# Altium footprint library NXP_60_26022015.PCBLIB: 287 footprints (part 12 of 18)
Each footprint in its own frame and in the unit in brackets; x right, y up, seen from the top. Pads: shape width x height; smd on the part's side, far side on the other; paste and mask are expansions set on the pad; w line width, h text height; cw(c..) or ccw(c..) is an arc to the next point about the centre after c.
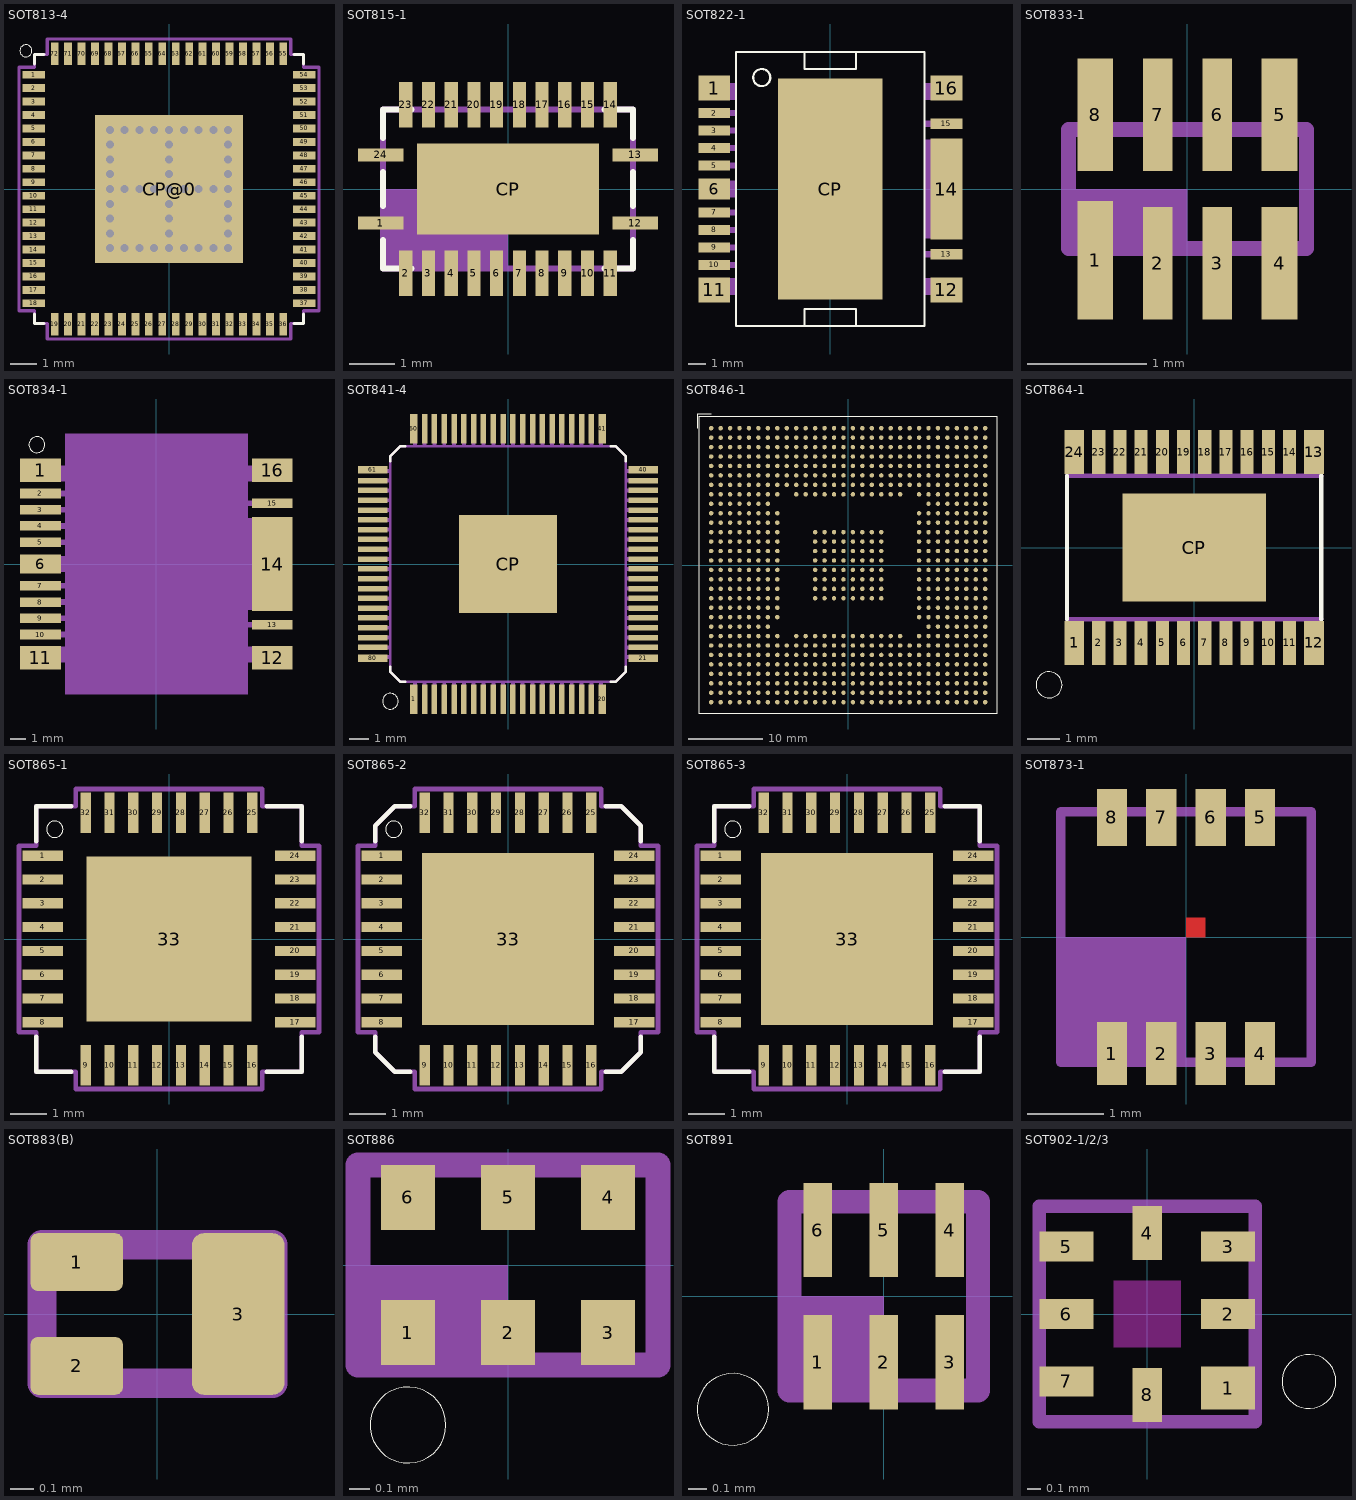
[diagram p11: the footprints below, top view; thin cyan lines are the x and y axes]

## SOT813-4 [mil]
pads (118):
  rect 33.46x11.42 smd: 1(-197.83,167.32) 2(-197.83,147.64) 3(-197.83,127.95) 4(-197.83,108.27) 5(-197.83,88.58) 6(-197.83,68.9) 7(-197.83,49.21) 8(-197.83,29.53) 9(-197.83,9.84) 10(-197.83,-9.84) 11(-197.83,-29.53) 12(-197.83,-49.21) 13(-197.83,-68.9) 14(-197.83,-88.58) 15(-197.83,-108.27) 16(-197.83,-127.95) 17(-197.83,-147.64) 18(-197.83,-167.32) 37(197.83,-167.32) 38(197.83,-147.64) 39(197.83,-127.95) 40(197.83,-108.27) 41(197.83,-88.58) 42(197.83,-68.9) 43(197.83,-49.21) 44(197.83,-29.53) 45(197.83,-9.84) 46(197.83,9.84) 47(197.83,29.53) 48(197.83,49.21) 49(197.83,68.9) 50(197.83,88.58) 51(197.83,108.27) 52(197.83,127.95) 53(197.83,147.64) 54(197.83,167.32)
  rect 11.42x33.46 smd: 19(-167.32,-197.83) 20(-147.64,-197.83) 21(-127.95,-197.83) 22(-108.27,-197.83) 23(-88.58,-197.83) 24(-68.9,-197.83) 25(-49.21,-197.83) 26(-29.53,-197.83) 27(-9.84,-197.83) 28(9.84,-197.83) 29(29.53,-197.83) 30(49.21,-197.83) 31(68.9,-197.83) 32(88.58,-197.83) 33(108.27,-197.83) 34(127.95,-197.83) 35(147.64,-197.83) 36(167.32,-197.83) 55(167.32,197.83) 56(147.64,197.83) 57(127.95,197.83) 58(108.27,197.83) 59(88.58,197.83) 60(68.9,197.83) 61(49.21,197.83) 62(29.53,197.83) 63(9.84,197.83) 64(-9.84,197.83) 65(-29.53,197.83) 66(-49.21,197.83) 67(-68.9,197.83) 68(-88.58,197.83) 69(-108.27,197.83) 70(-127.95,197.83) 71(-147.64,197.83) 72(-167.32,197.83)
  rect 216.54x216.54 smd: CP@0(0,0)
  round 16 hole 11.81: CP@1(43.31,86.61) CP@2(21.65,86.61) CP@3(0,86.61) CP@4(-21.65,86.61) CP@5(-43.31,86.61) CP@6(-64.96,86.61) CP@7(-86.61,86.61) CP@8(-86.61,64.96) CP@9(-86.61,43.31) CP@10(-86.61,21.65) CP@11(-86.61,0) CP@12(-86.61,-21.65) CP@13(-86.61,-43.31) CP@14(-86.61,-64.96) CP@15(-86.61,-86.61) CP@16(-64.96,-86.61) CP@17(-43.31,-86.61) CP@18(-21.65,-86.61) CP@19(0,-86.61) CP@20(21.65,-86.61) CP@21(43.31,-86.61) CP@22(64.96,-86.61) CP@23(86.61,-86.61) CP@24(86.61,-64.96) CP@25(86.61,-43.31) CP@26(86.61,-21.65) CP@27(86.61,0) CP@28(86.61,21.65) CP@29(86.61,43.31) CP@30(86.61,64.96) CP@31(86.61,86.61) CP@32(64.96,86.61) CP@33(0,64.96) CP@34(0,43.31) CP@35(0,21.65) CP@36(0,0) CP@37(0,-21.65) CP@38(0,-43.31) CP@39(0,-64.96) CP@40(-64.96,0) CP@41(-43.31,0) CP@42(-21.65,0) CP@43(21.65,0) CP@44(43.31,0) CP@45(64.96,0)
Top Overlay:
  circle w0: c-209.35,202.17 r8.8
  lines w5: -196.85,-183.07 -196.85,-196.85 -183.07,-196.85 ; -196.85,183.07 -196.85,196.85 -183.07,196.85 ; 183.07,-196.85 196.85,-196.85 196.85,-183.07 ; 183.07,196.85 196.85,196.85 196.85,183.07
Top Paste:
  rectangle: -68.9,17.72 -17.72,68.9
  rectangle: 17.72,17.72 68.9,68.9
  rectangle: 17.72,-68.9 68.9,-17.72
  rectangle: -68.9,-68.9 -17.72,-17.72
Top Solder:
  rectangle: -110.83,-110.83 110.83,110.83
Mechanical 16:
  lines w5: -219.49,-178.15 -219.49,178.15 -196.85,178.15 -196.85,196.85 -178.15,196.85 -178.15,219.49 178.15,219.49 178.15,196.85 196.85,196.85 196.85,178.15 219.49,178.15 219.49,-178.15 196.85,-178.15 196.85,-196.85 178.15,-196.85 178.15,-219.49 -178.15,-219.49 -178.15,-196.85 -196.85,-196.85 -196.85,-178.15 -219.49,-178.15

## SOT815-1 [mm]
pads (25):
  rect 1x0.29 smd: 1(-2.8,-0.75) 12(2.8,-0.75) 13(2.8,0.75) 24(-2.8,0.75)
  rect 0.29x1 smd: 2(-2.25,-1.85) 3(-1.75,-1.85) 4(-1.25,-1.85) 5(-0.75,-1.85) 6(-0.25,-1.85) 7(0.25,-1.85) 8(0.75,-1.85) 9(1.25,-1.85) 10(1.75,-1.85) 11(2.25,-1.85) 14(2.25,1.85) 15(1.75,1.85) 16(1.25,1.85) 17(0.75,1.85) 18(0.25,1.85) 19(-0.25,1.85) 20(-0.75,1.85) 21(-1.25,1.85) 22(-1.75,1.85) 23(-2.25,1.85)
  rect 4x2 smd: CP(0,0)
Top Overlay:
  lines w0.127: -2.75,-1.125 -2.75,-1.75 -2.125,-1.75 ; -2.75,-0.375 -2.75,0.375 ; -2.75,1.125 -2.75,1.75 -2.125,1.75 ; 2.125,-1.75 2.75,-1.75 2.75,-1.125 ; 2.125,1.75 2.75,1.75 2.75,1.125 ; 2.75,-0.375 2.75,0.375
Top Paste:
  rectangle: -0.3,0.15 0.3,0.6
  rectangle: -0.3,-0.6 0.3,-0.15
  rectangle: 0.6,0.15 1.2,0.6
  rectangle: 0.6,-0.6 1.2,-0.15
  rectangle: -1.2,0.15 -0.6,0.6
  rectangle: -1.2,-0.6 -0.6,-0.15
Mechanical 16:
  rectangle: -2.75,-1.75 0,0
  lines w0.127: -2.75,-1.75 2.75,-1.75 2.75,1.75 -2.75,1.75 -2.75,-1.75

## SOT822-1 [mm]
pads (17):
  rect 1.85x1.45 smd: 1(-6.775,5.89) 11(-6.775,-5.89) 12(6.775,-5.89) 16(6.775,5.89)
  rect 1.85x0.6 smd: 2(-6.775,4.43) 3(-6.775,3.41) 4(-6.775,2.39) 5(-6.775,1.37) 7(-6.775,-1.37) 8(-6.775,-2.39) 9(-6.775,-3.41) 10(-6.775,-4.43) 13(6.775,-3.81) 15(6.775,3.81)
  rect 1.85x1.2 smd: 6(-6.775,0)
  rect 1.85x5.9 smd: 14(6.775,0)
  rect 6.1x12.9 smd: CP(0,0)
Top Overlay:
  circle w0.127: c-4,6.5 r0.5
  lines w0.127: -1.5,-8 -5.5,-8 -5.5,8 -1.5,8 ; -1.5,-8 1.5,-8 ; -1.5,-8 -1.5,-7 1.5,-7 1.5,-8 ; -1.5,8 1.5,8 ; -1.5,8 -1.5,7 1.5,7 1.5,8 ; 1.5,-8 5.5,-8 5.5,8 1.5,8
Top Paste:
  rectangle: -7.675,5.19 -5.875,6.59
  rectangle: 5.875,5.19 7.675,6.59
  rectangle: -7.675,-6.59 -5.875,-5.19
  rectangle: 5.875,-6.59 7.675,-5.19
  rectangle: -7.675,1.095 -5.875,1.645
  rectangle: 5.875,0.225 7.675,2.925
  rectangle: -7.675,-0.575 -5.875,0.575
  rectangle: -7.675,-1.645 -5.875,-1.095
  rectangle: -7.675,2.115 -5.875,2.665
  rectangle: -7.675,-2.665 -5.875,-2.115
  rectangle: 5.875,3.535 7.675,4.085
  rectangle: -7.675,3.135 -5.875,3.685
  rectangle: -7.675,-3.685 -5.875,-3.135
  rectangle: -7.675,4.155 -5.875,4.705
  rectangle: -7.675,-4.705 -5.875,-4.155
  rectangle: 5.875,-2.925 7.675,-0.225
  rectangle: 5.875,-4.085 7.675,-3.535
  rectangle: -0.55,-0.55 0.55,0.55
  rectangle: 0.95,-0.55 2.05,0.55
  rectangle: -2.05,-0.55 -0.95,0.55
  rectangle: -2.05,0.95 -0.95,2.05
  rectangle: -0.55,0.95 0.55,2.05
  rectangle: 0.95,0.95 2.05,2.05
  rectangle: -2.05,-2.05 -0.95,-0.95
  rectangle: -0.55,-2.05 0.55,-0.95
  rectangle: 0.95,-2.05 2.05,-0.95
  rectangle: -2.05,-3.55 -0.95,-2.45
  rectangle: -0.55,-3.55 0.55,-2.45
  rectangle: 0.95,-3.55 2.05,-2.45
  rectangle: 0.95,2.45 2.05,3.55
  rectangle: -0.55,2.45 0.55,3.55
  rectangle: -2.05,2.45 -0.95,3.55
Top Solder:
  rectangle: -7.775,5.09 -5.775,6.69
  rectangle: 5.775,5.09 7.775,6.69
  rectangle: -7.775,-6.69 -5.775,-5.09
  rectangle: 5.775,-6.69 7.775,-5.09
  rectangle: -7.775,0.995 -5.775,1.745
  rectangle: 5.775,-3.025 7.775,3.025
  rectangle: -7.775,-0.675 -5.775,0.675
  rectangle: -7.775,-1.745 -5.775,-0.995
  rectangle: -7.775,2.015 -5.775,2.765
  rectangle: -7.775,-2.765 -5.775,-2.015
  rectangle: 5.775,3.435 7.775,4.185
  rectangle: -7.775,3.035 -5.775,3.785
  rectangle: -7.775,-3.785 -5.775,-3.035
  rectangle: -7.775,4.055 -5.775,4.805
  rectangle: -7.775,-4.805 -5.775,-4.055
  rectangle: 5.775,-4.185 7.775,-3.435
  rectangle: -3.123,-6.525 3.125,6.525
Mechanical 16:
  rectangle: -7.1,-0.5 -5.5,0.5
  rectangle: -7.1,-6.19 -5.5,-5.19
  rectangle: -7.1,5.19 -5.5,6.19
  rectangle: 5.5,5.19 7.1,6.19
  rectangle: 5.5,-6.19 7.1,-5.19
  rectangle: -7.1,3.23 -5.5,3.59
  rectangle: -7.1,1.19 -5.5,1.55
  rectangle: -7.1,-1.55 -5.5,-1.19
  rectangle: -7.1,2.21 -5.5,2.57
  rectangle: -7.1,-2.57 -5.5,-2.21
  rectangle: -7.1,-3.59 -5.5,-3.23
  rectangle: 5.5,-3.99 7.1,-3.63
  rectangle: -7.1,4.25 -5.5,4.61
  rectangle: -7.1,-4.61 -5.5,-4.25
  rectangle: 5.5,3.63 7.1,3.99
  rectangle: 5.5,-2.9 7.1,2.9

## SOT833-1 [mm]
pads (8):
  rect 0.3x1 smd: 1(-0.775,-0.6)
  rect 0.25x0.95 smd: 2(-0.25,-0.625) 3(0.25,-0.625) 6(0.25,0.625) 7(-0.25,0.625)
  rect 0.3x0.95 smd: 4(0.775,-0.625) 5(0.775,0.625) 8(-0.775,0.625)
Top Paste:
  rectangle: -0.9,-1.075 -0.65,-0.125
  rectangle: -0.35,-1.075 -0.15,-0.175
  rectangle: 0.15,-1.075 0.35,-0.175
  rectangle: 0.65,-1.075 0.9,-0.175
  rectangle: 0.65,0.175 0.9,1.075
  rectangle: 0.15,0.175 0.35,1.075
  rectangle: -0.35,0.175 -0.15,1.075
  rectangle: -0.9,0.175 -0.65,1.075
Mechanical 16:
  rectangle: -1,-0.5 0,0
  lines w0.127: -1,-0.5 1,-0.5 1,0.5 -1,0.5 -1,-0.5

## SOT834-1 [mm]
pads (16):
  rect 2.55x1.45 smd: 1(-7.275,5.89) 11(-7.275,-5.89) 12(7.275,-5.89) 16(7.275,5.89)
  rect 2.55x0.6 smd: 2(-7.275,4.43) 3(-7.275,3.41) 4(-7.275,2.39) 5(-7.275,1.37) 7(-7.275,-1.37) 8(-7.275,-2.39) 9(-7.275,-3.41) 10(-7.275,-4.43) 13(7.275,-3.81) 15(7.275,3.81)
  rect 2.55x1.2 smd: 6(-7.275,0)
  rect 2.55x5.9 smd: 14(7.275,0)
Top Overlay:
  circle w0: c-7.5,7.5 r0.5
Top Paste:
  rectangle: -8.525,5.19 -6.025,6.59
  rectangle: 6.025,5.19 8.525,6.59
  rectangle: -8.525,-6.59 -6.025,-5.19
  rectangle: 6.025,-6.59 8.525,-5.19
  rectangle: -8.525,1.095 -6.025,1.645
  rectangle: 6.025,0.225 8.525,2.925
  rectangle: -8.525,-0.575 -6.025,0.575
  rectangle: -8.525,-1.645 -6.025,-1.095
  rectangle: -8.525,2.115 -6.025,2.665
  rectangle: -8.525,-2.665 -6.025,-2.115
  rectangle: 6.025,3.535 8.525,4.085
  rectangle: -8.525,3.135 -6.025,3.685
  rectangle: -8.525,-3.685 -6.025,-3.135
  rectangle: -8.525,4.155 -6.025,4.705
  rectangle: -8.525,-4.705 -6.025,-4.155
  rectangle: 6.025,-2.925 8.525,-0.225
  rectangle: 6.025,-4.085 8.525,-3.535
Top Solder:
  rectangle: -8.625,5.09 -5.925,6.69
  rectangle: 5.925,5.09 8.625,6.69
  rectangle: -8.625,-6.69 -5.925,-5.09
  rectangle: 5.925,-6.69 8.625,-5.09
  rectangle: -8.625,0.995 -5.925,1.745
  rectangle: 5.925,-3.025 8.625,3.025
  rectangle: -8.625,-0.675 -5.925,0.675
  rectangle: -8.625,-1.745 -5.925,-0.995
  rectangle: -8.625,2.015 -5.925,2.765
  rectangle: -8.625,-2.765 -5.925,-2.015
  rectangle: 5.925,3.435 8.625,4.185
  rectangle: -8.625,3.035 -5.925,3.785
  rectangle: -8.625,-3.785 -5.925,-3.035
  rectangle: -8.625,4.055 -5.925,4.805
  rectangle: -8.625,-4.805 -5.925,-4.055
  rectangle: 5.925,-4.185 8.625,-3.435
Mechanical 11:
  rectangle: -5.75,-8.2 5.75,8.2
Mechanical 16:
  circle w0.127: c-4,6.5 r0.5
  rectangle: -8,-0.5 -5.5,0.5
  rectangle: -8,-6.19 -5.5,-5.19
  rectangle: -8,5.19 -5.5,6.19
  rectangle: 5.5,5.19 8,6.19
  rectangle: 5.5,-6.19 8,-5.19
  rectangle: -8,3.23 -5.5,3.59
  rectangle: -8,1.19 -5.5,1.55
  rectangle: -8,-1.55 -5.5,-1.19
  rectangle: -8,2.21 -5.5,2.57
  rectangle: -8,-2.57 -5.5,-2.21
  rectangle: -8,-3.59 -5.5,-3.23
  rectangle: 5.5,-3.99 8,-3.63
  rectangle: -8,4.25 -5.5,4.61
  rectangle: -8,-4.61 -5.5,-4.25
  rectangle: 5.5,3.63 8,3.99
  rectangle: 5.5,-2.9 8,2.9
  lines w0.127: -1.5,-8 -5.5,-8 -5.5,8 -1.5,8 ; -1.5,-8 1.5,-8 ; -1.5,-8 -1.5,-7 1.5,-7 1.5,-8 ; -1.5,8 1.5,8 ; -1.5,8 -1.5,7 1.5,7 1.5,8 ; 1.5,-8 5.5,-8 5.5,8 1.5,8

## SOT841-4 [mm]
pads (81):
  rect 0.4x1.5 smd: 1(-4.81,-6.9) 20(4.81,-6.9) 41(4.81,6.9) 60(-4.81,6.9)
  rect 0.28x1.5 smd: 2(-4.25,-6.9) 3(-3.75,-6.9) 4(-3.25,-6.9) 5(-2.75,-6.9) 6(-2.25,-6.9) 7(-1.75,-6.9) 8(-1.25,-6.9) 9(-0.75,-6.9) 10(-0.25,-6.9) 11(0.25,-6.9) 12(0.75,-6.9) 13(1.25,-6.9) 14(1.75,-6.9) 15(2.25,-6.9) 16(2.75,-6.9) 17(3.25,-6.9) 18(3.75,-6.9) 19(4.25,-6.9) 42(4.25,6.9) 43(3.75,6.9) 44(3.25,6.9) 45(2.75,6.9) 46(2.25,6.9) 47(1.75,6.9) 48(1.25,6.9) 49(0.75,6.9) 50(0.25,6.9) 51(-0.25,6.9) 52(-0.75,6.9) 53(-1.25,6.9) 54(-1.75,6.9) 55(-2.25,6.9) 56(-2.75,6.9) 57(-3.25,6.9) 58(-3.75,6.9) 59(-4.25,6.9)
  rect 1.5x0.4 smd: 21(6.9,-4.81) 40(6.9,4.81) 61(-6.9,4.81) 80(-6.9,-4.81)
  rect 1.5x0.28 smd: 22(6.9,-4.25) 23(6.9,-3.75) 24(6.9,-3.25) 25(6.9,-2.75) 26(6.9,-2.25) 27(6.9,-1.75) 28(6.9,-1.25) 29(6.9,-0.75) 30(6.9,-0.25) 31(6.9,0.25) 32(6.9,0.75) 33(6.9,1.25) 34(6.9,1.75) 35(6.9,2.25) 36(6.9,2.75) 37(6.9,3.25) 38(6.9,3.75) 39(6.9,4.25) 62(-6.9,4.25) 63(-6.9,3.75) 64(-6.9,3.25) 65(-6.9,2.75) 66(-6.9,2.25) 67(-6.9,1.75) 68(-6.9,1.25) 69(-6.9,0.75) 70(-6.9,0.25) 71(-6.9,-0.25) 72(-6.9,-0.75) 73(-6.9,-1.25) 74(-6.9,-1.75) 75(-6.9,-2.25) 76(-6.9,-2.75) 77(-6.9,-3.25) 78(-6.9,-3.75) 79(-6.9,-4.25)
  rect 5x5 smd: CP(0,0)
Top Overlay:
  circle w0: c-6,-7 r0.4
  lines w0.127: -6,-5.25 -6,-5.5 -5.5,-6 -5.25,-6 ; -6,5.25 -6,5.5 -5.5,6 -5.25,6 ; 5.25,-6 5.5,-6 6,-5.5 6,-5.25 ; 5.25,6 5.5,6 6,5.5 6,5.25
Top Paste:
  rectangle: 0.25,0.25 1.1,1.1
  rectangle: 0.25,-1.1 1.1,-0.25
  rectangle: 0.25,1.6 1.1,2.45
  rectangle: 1.6,1.6 2.45,2.45
  rectangle: 1.6,0.25 2.45,1.1
  rectangle: 1.6,-1.1 2.45,-0.25
  rectangle: 1.6,-2.45 2.45,-1.6
  rectangle: 0.25,-2.45 1.1,-1.6
  rectangle: -1.1,-1.1 -0.25,-0.25
  rectangle: -1.1,-2.45 -0.25,-1.6
  rectangle: -1.1,0.25 -0.25,1.1
  rectangle: -1.1,1.6 -0.25,2.45
  rectangle: -2.45,1.6 -1.6,2.45
  rectangle: -2.45,0.25 -1.6,1.1
  rectangle: -2.45,-1.1 -1.6,-0.25
  rectangle: -2.45,-2.45 -1.6,-1.6
Mechanical 16:
  rectangle: 0.15,6 0.35,7
  rectangle: 0.65,6 0.85,7
  rectangle: 1.15,6 1.35,7
  rectangle: 1.65,6 1.85,7
  rectangle: 2.15,6 2.35,7
  rectangle: 2.65,6 2.85,7
  rectangle: 3.15,6 3.35,7
  rectangle: 3.65,6 3.85,7
  rectangle: 4.15,6 4.35,7
  rectangle: 4.65,6 4.85,7
  rectangle: -0.35,6 -0.15,7
  rectangle: -0.85,6 -0.65,7
  rectangle: -1.35,6 -1.15,7
  rectangle: -1.85,6 -1.65,7
  rectangle: -2.35,6 -2.15,7
  rectangle: -2.85,6 -2.65,7
  rectangle: -3.35,6 -3.15,7
  rectangle: -3.85,6 -3.65,7
  rectangle: -4.35,6 -4.15,7
  rectangle: -4.85,6 -4.65,7
  region: 7,0.15 7,0.35 6,0.35 6,0.15
  region: 7,0.65 7,0.85 6,0.85 6,0.65
  region: 7,1.15 7,1.35 6,1.35 6,1.15
  region: 7,1.65 7,1.85 6,1.85 6,1.65
  region: 7,2.15 7,2.35 6,2.35 6,2.15
  region: 7,2.65 7,2.85 6,2.85 6,2.65
  region: 7,3.15 7,3.35 6,3.35 6,3.15
  region: 7,3.65 7,3.85 6,3.85 6,3.65
  region: 7,4.15 7,4.35 6,4.35 6,4.15
  region: 7,4.65 7,4.85 6,4.85 6,4.65
  region: 7,-0.35 7,-0.15 6,-0.15 6,-0.35
  region: 7,-0.85 7,-0.65 6,-0.65 6,-0.85
  region: 7,-1.35 7,-1.15 6,-1.15 6,-1.35
  region: 7,-1.85 7,-1.65 6,-1.65 6,-1.85
  region: 7,-2.35 7,-2.15 6,-2.15 6,-2.35
  region: 7,-2.85 7,-2.65 6,-2.65 6,-2.85
  region: 7,-3.35 7,-3.15 6,-3.15 6,-3.35
  region: 7,-3.85 7,-3.65 6,-3.65 6,-3.85
  region: 7,-4.35 7,-4.15 6,-4.15 6,-4.35
  region: 7,-4.85 7,-4.65 6,-4.65 6,-4.85
  rectangle: 0.15,-7 0.35,-6
  rectangle: 0.65,-7 0.85,-6
  rectangle: 1.15,-7 1.35,-6
  rectangle: 1.65,-7 1.85,-6
  rectangle: 2.15,-7 2.35,-6
  rectangle: 2.65,-7 2.85,-6
  rectangle: 3.15,-7 3.35,-6
  rectangle: 3.65,-7 3.85,-6
  rectangle: 4.15,-7 4.35,-6
  rectangle: 4.65,-7 4.85,-6
  rectangle: -0.35,-7 -0.15,-6
  rectangle: -0.85,-7 -0.65,-6
  rectangle: -1.35,-7 -1.15,-6
  rectangle: -1.85,-7 -1.65,-6
  rectangle: -2.35,-7 -2.15,-6
  rectangle: -2.85,-7 -2.65,-6
  rectangle: -3.35,-7 -3.15,-6
  rectangle: -3.85,-7 -3.65,-6
  rectangle: -4.35,-7 -4.15,-6
  rectangle: -4.85,-7 -4.65,-6
  region: -6,0.15 -6,0.35 -7,0.35 -7,0.15
  region: -6,0.65 -6,0.85 -7,0.85 -7,0.65
  region: -6,1.15 -6,1.35 -7,1.35 -7,1.15
  region: -6,1.65 -6,1.85 -7,1.85 -7,1.65
  region: -6,2.15 -6,2.35 -7,2.35 -7,2.15
  region: -6,2.65 -6,2.85 -7,2.85 -7,2.65
  region: -6,3.15 -6,3.35 -7,3.35 -7,3.15
  region: -6,3.65 -6,3.85 -7,3.85 -7,3.65
  region: -6,4.15 -6,4.35 -7,4.35 -7,4.15
  region: -6,4.65 -6,4.85 -7,4.85 -7,4.65
  region: -6,-0.35 -6,-0.15 -7,-0.15 -7,-0.35
  region: -6,-0.85 -6,-0.65 -7,-0.65 -7,-0.85
  region: -6,-1.35 -6,-1.15 -7,-1.15 -7,-1.35
  region: -6,-1.85 -6,-1.65 -7,-1.65 -7,-1.85
  region: -6,-2.35 -6,-2.15 -7,-2.15 -7,-2.35
  region: -6,-2.85 -6,-2.65 -7,-2.65 -7,-2.85
  region: -6,-3.35 -6,-3.15 -7,-3.15 -7,-3.35
  region: -6,-3.85 -6,-3.65 -7,-3.65 -7,-3.85
  region: -6,-4.35 -6,-4.15 -7,-4.15 -7,-4.35
  region: -6,-4.85 -6,-4.65 -7,-4.65 -7,-4.85
  lines w0.127: -6,-5.5 -5.5,-6 5.5,-6 6,-5.5 6,5.5 5.5,6 -5.5,6 -6,5.5 -6,-5.5

## SOT846-1 [mm]
pads (760):
  rrect100% 0.6x0.6 smd: A1(-18.415,18.415) A2(-17.145,18.415) A3(-15.875,18.415) A4(-14.605,18.415) A5(-13.335,18.415) A6(-12.065,18.415) A7(-10.795,18.415) A8(-9.525,18.415) A9(-8.255,18.415) A10(-6.985,18.415) A11(-5.715,18.415) A12(-4.445,18.415) A13(-3.175,18.415) A14(-1.905,18.415) A15(-0.635,18.415) A16(0.635,18.415) A17(1.905,18.415) A18(3.175,18.415) A19(4.445,18.415) A20(5.715,18.415) A21(6.985,18.415) A22(8.255,18.415) A23(9.525,18.415) A24(10.795,18.415) A25(12.065,18.415) A26(13.335,18.415) A27(14.605,18.415) A28(15.875,18.415) A29(17.145,18.415) A30(18.415,18.415) AA1(-18.415,-6.985) AA2(-17.145,-6.985) AA3(-15.875,-6.985) AA4(-14.605,-6.985) AA5(-13.335,-6.985) AA6(-12.065,-6.985) AA7(-10.795,-6.985) AA8(-9.525,-6.985) AA23(9.525,-6.985) AA24(10.795,-6.985) AA25(12.065,-6.985) AA26(13.335,-6.985) AA27(14.605,-6.985) AA28(15.875,-6.985) AA29(17.145,-6.985) AA30(18.415,-6.985) AB1(-18.415,-8.255) AB2(-17.145,-8.255) AB3(-15.875,-8.255) AB4(-14.605,-8.255) AB5(-13.335,-8.255) AB6(-12.065,-8.255) AB7(-10.795,-8.255) AB24(10.795,-8.255) AB25(12.065,-8.255) AB26(13.335,-8.255) AB27(14.605,-8.255) AB28(15.875,-8.255) AB29(17.145,-8.255) AB30(18.415,-8.255) AC1(-18.415,-9.525) AC2(-17.145,-9.525) AC3(-15.875,-9.525) AC4(-14.605,-9.525) AC5(-13.335,-9.525) AC6(-12.065,-9.525) AC7(-10.795,-9.525) AC8(-9.525,-9.525) AC10(-6.985,-9.525) AC11(-5.715,-9.525) AC12(-4.445,-9.525) AC13(-3.175,-9.525) AC14(-1.905,-9.525) AC15(-0.635,-9.525) AC16(0.635,-9.525) AC17(1.905,-9.525) AC18(3.175,-9.525) AC19(4.445,-9.525) AC20(5.715,-9.525) AC21(6.985,-9.525) AC23(9.525,-9.525) AC24(10.795,-9.525) AC25(12.065,-9.525) AC26(13.335,-9.525) AC27(14.605,-9.525) AC28(15.875,-9.525) AC29(17.145,-9.525) AC30(18.415,-9.525) AD1(-18.415,-10.795) AD2(-17.145,-10.795) AD3(-15.875,-10.795) AD4(-14.605,-10.795) AD5(-13.335,-10.795) AD6(-12.065,-10.795) AD7(-10.795,-10.795) AD8(-9.525,-10.795) AD9(-8.255,-10.795) AD10(-6.985,-10.795) AD11(-5.715,-10.795) AD12(-4.445,-10.795) AD13(-3.175,-10.795) AD14(-1.905,-10.795) AD15(-0.635,-10.795) AD16(0.635,-10.795) AD17(1.905,-10.795) AD18(3.175,-10.795) AD19(4.445,-10.795) AD20(5.715,-10.795) AD21(6.985,-10.795) AD22(8.255,-10.795) AD23(9.525,-10.795) AD24(10.795,-10.795) AD25(12.065,-10.795) AD26(13.335,-10.795) AD27(14.605,-10.795) AD28(15.875,-10.795) AD29(17.145,-10.795) AD30(18.415,-10.795) AE1(-18.415,-12.065) AE2(-17.145,-12.065) AE3(-15.875,-12.065) AE4(-14.605,-12.065) AE5(-13.335,-12.065) AE6(-12.065,-12.065) AE7(-10.795,-12.065) AE8(-9.525,-12.065) AE9(-8.255,-12.065) AE10(-6.985,-12.065) AE11(-5.715,-12.065) AE12(-4.445,-12.065) AE13(-3.175,-12.065) AE14(-1.905,-12.065) AE15(-0.635,-12.065) AE16(0.635,-12.065) AE17(1.905,-12.065) AE18(3.175,-12.065) AE19(4.445,-12.065) AE20(5.715,-12.065) AE21(6.985,-12.065) AE22(8.255,-12.065) AE23(9.525,-12.065) AE24(10.795,-12.065) AE25(12.065,-12.065) AE26(13.335,-12.065) AE27(14.605,-12.065) AE28(15.875,-12.065) AE29(17.145,-12.065) AE30(18.415,-12.065) AF1(-18.415,-13.335) AF2(-17.145,-13.335) AF3(-15.875,-13.335) AF4(-14.605,-13.335) AF5(-13.335,-13.335) AF6(-12.065,-13.335) AF7(-10.795,-13.335) AF8(-9.525,-13.335) AF9(-8.255,-13.335) AF10(-6.985,-13.335) AF11(-5.715,-13.335) AF12(-4.445,-13.335) AF13(-3.175,-13.335) AF14(-1.905,-13.335) AF15(-0.635,-13.335) AF16(0.635,-13.335) AF17(1.905,-13.335) AF18(3.175,-13.335) AF19(4.445,-13.335) AF20(5.715,-13.335) AF21(6.985,-13.335) AF22(8.255,-13.335) AF23(9.525,-13.335) AF24(10.795,-13.335) AF25(12.065,-13.335) AF26(13.335,-13.335) AF27(14.605,-13.335) AF28(15.875,-13.335) AF29(17.145,-13.335) AF30(18.415,-13.335) AG1(-18.415,-14.605) AG2(-17.145,-14.605) AG3(-15.875,-14.605) AG4(-14.605,-14.605) AG5(-13.335,-14.605) AG6(-12.065,-14.605) AG7(-10.795,-14.605) AG8(-9.525,-14.605) AG9(-8.255,-14.605) AG10(-6.985,-14.605) AG11(-5.715,-14.605) AG12(-4.445,-14.605) AG13(-3.175,-14.605) AG14(-1.905,-14.605) AG15(-0.635,-14.605) AG16(0.635,-14.605) AG17(1.905,-14.605) AG18(3.175,-14.605) AG19(4.445,-14.605) AG20(5.715,-14.605) AG21(6.985,-14.605) AG22(8.255,-14.605) AG23(9.525,-14.605) AG24(10.795,-14.605) AG25(12.065,-14.605) AG26(13.335,-14.605) AG27(14.605,-14.605) AG28(15.875,-14.605) AG29(17.145,-14.605) AG30(18.415,-14.605) AH1(-18.415,-15.875) AH2(-17.145,-15.875) AH3(-15.875,-15.875) AH4(-14.605,-15.875) AH5(-13.335,-15.875) AH6(-12.065,-15.875) AH7(-10.795,-15.875) AH8(-9.525,-15.875) AH9(-8.255,-15.875) AH10(-6.985,-15.875) AH11(-5.715,-15.875) AH12(-4.445,-15.875) AH13(-3.175,-15.875) AH14(-1.905,-15.875) AH15(-0.635,-15.875) AH16(0.635,-15.875) AH17(1.905,-15.875) AH18(3.175,-15.875) AH19(4.445,-15.875) AH20(5.715,-15.875) AH21(6.985,-15.875) AH22(8.255,-15.875) AH23(9.525,-15.875) AH24(10.795,-15.875) AH25(12.065,-15.875) AH26(13.335,-15.875) AH27(14.605,-15.875) AH28(15.875,-15.875) AH29(17.145,-15.875) AH30(18.415,-15.875) AJ1(-18.415,-17.145) AJ2(-17.145,-17.145) AJ3(-15.875,-17.145) AJ4(-14.605,-17.145) AJ5(-13.335,-17.145) AJ6(-12.065,-17.145) AJ7(-10.795,-17.145) AJ8(-9.525,-17.145) AJ9(-8.255,-17.145) AJ10(-6.985,-17.145) AJ11(-5.715,-17.145) AJ12(-4.445,-17.145) AJ13(-3.175,-17.145) AJ14(-1.905,-17.145) AJ15(-0.635,-17.145) AJ16(0.635,-17.145) AJ17(1.905,-17.145) AJ18(3.175,-17.145) AJ19(4.445,-17.145) AJ20(5.715,-17.145) AJ21(6.985,-17.145) AJ22(8.255,-17.145) AJ23(9.525,-17.145) AJ24(10.795,-17.145) AJ25(12.065,-17.145) AJ26(13.335,-17.145) AJ27(14.605,-17.145) AJ28(15.875,-17.145) AJ29(17.145,-17.145) AJ30(18.415,-17.145) AK1(-18.415,-18.415) AK2(-17.145,-18.415) AK3(-15.875,-18.415) AK4(-14.605,-18.415) AK5(-13.335,-18.415) AK6(-12.065,-18.415) AK7(-10.795,-18.415) AK8(-9.525,-18.415) AK9(-8.255,-18.415) AK10(-6.985,-18.415) AK11(-5.715,-18.415) AK12(-4.445,-18.415) AK13(-3.175,-18.415) AK14(-1.905,-18.415) AK15(-0.635,-18.415) AK16(0.635,-18.415) AK17(1.905,-18.415) AK18(3.175,-18.415) AK19(4.445,-18.415) AK20(5.715,-18.415) AK21(6.985,-18.415) AK22(8.255,-18.415) AK23(9.525,-18.415) AK24(10.795,-18.415) AK25(12.065,-18.415) AK26(13.335,-18.415) AK27(14.605,-18.415) AK28(15.875,-18.415) AK29(17.145,-18.415) AK30(18.415,-18.415) B1(-18.415,17.145) B2(-17.145,17.145) B3(-15.875,17.145) B4(-14.605,17.145) B5(-13.335,17.145) B6(-12.065,17.145) B7(-10.795,17.145) B8(-9.525,17.145) B9(-8.255,17.145) B10(-6.985,17.145) B11(-5.715,17.145) B12(-4.445,17.145) B13(-3.175,17.145) B14(-1.905,17.145) B15(-0.635,17.145) B16(0.635,17.145) B17(1.905,17.145) B18(3.175,17.145) B19(4.445,17.145) B20(5.715,17.145) B21(6.985,17.145) B22(8.255,17.145) B23(9.525,17.145) B24(10.795,17.145) B25(12.065,17.145) B26(13.335,17.145) B27(14.605,17.145) B28(15.875,17.145) B29(17.145,17.145) B30(18.415,17.145) C1(-18.415,15.875) C2(-17.145,15.875) C3(-15.875,15.875) C4(-14.605,15.875) C5(-13.335,15.875) C6(-12.065,15.875) C7(-10.795,15.875) C8(-9.525,15.875) C9(-8.255,15.875) C10(-6.985,15.875) C11(-5.715,15.875) C12(-4.445,15.875) C13(-3.175,15.875) C14(-1.905,15.875) C15(-0.635,15.875) C16(0.635,15.875) C17(1.905,15.875) C18(3.175,15.875) C19(4.445,15.875) C20(5.715,15.875) C21(6.985,15.875) C22(8.255,15.875) C23(9.525,15.875) C24(10.795,15.875) C25(12.065,15.875) C26(13.335,15.875) C27(14.605,15.875) C28(15.875,15.875) C29(17.145,15.875) C30(18.415,15.875) D1(-18.415,14.605) D2(-17.145,14.605) D3(-15.875,14.605) D4(-14.605,14.605) D5(-13.335,14.605) D6(-12.065,14.605) D7(-10.795,14.605) D8(-9.525,14.605) D9(-8.255,14.605) D10(-6.985,14.605) D11(-5.715,14.605) D12(-4.445,14.605) D13(-3.175,14.605) D14(-1.905,14.605) D15(-0.635,14.605) D16(0.635,14.605) D17(1.905,14.605) D18(3.175,14.605) D19(4.445,14.605) D20(5.715,14.605) D21(6.985,14.605) D22(8.255,14.605) D23(9.525,14.605) D24(10.795,14.605) D25(12.065,14.605) D26(13.335,14.605) D27(14.605,14.605) D28(15.875,14.605) D29(17.145,14.605) D30(18.415,14.605) E1(-18.415,13.335) E2(-17.145,13.335) E3(-15.875,13.335) E4(-14.605,13.335) E5(-13.335,13.335) E6(-12.065,13.335) E7(-10.795,13.335) E8(-9.525,13.335) E9(-8.255,13.335) E10(-6.985,13.335) E11(-5.715,13.335) E12(-4.445,13.335) E13(-3.175,13.335) E14(-1.905,13.335) E15(-0.635,13.335) E16(0.635,13.335) E17(1.905,13.335) E18(3.175,13.335) E19(4.445,13.335) E20(5.715,13.335) E21(6.985,13.335) E22(8.255,13.335) E23(9.525,13.335) E24(10.795,13.335) E25(12.065,13.335) E26(13.335,13.335) E27(14.605,13.335) E28(15.875,13.335) E29(17.145,13.335) E30(18.415,13.335) F1(-18.415,12.065) F2(-17.145,12.065) F3(-15.875,12.065) F4(-14.605,12.065) F5(-13.335,12.065) F6(-12.065,12.065) F7(-10.795,12.065) F8(-9.525,12.065) F9(-8.255,12.065) F10(-6.985,12.065) F11(-5.715,12.065) F12(-4.445,12.065) F13(-3.175,12.065) F14(-1.905,12.065) F15(-0.635,12.065) F16(0.635,12.065) F17(1.905,12.065) F18(3.175,12.065) F19(4.445,12.065) F20(5.715,12.065) F21(6.985,12.065) F22(8.255,12.065) F23(9.525,12.065) F24(10.795,12.065) F25(12.065,12.065) F26(13.335,12.065) F27(14.605,12.065) F28(15.875,12.065) F29(17.145,12.065) F30(18.415,12.065) G1(-18.415,10.795) G2(-17.145,10.795) G3(-15.875,10.795) G4(-14.605,10.795) G5(-13.335,10.795) G6(-12.065,10.795) G7(-10.795,10.795) G8(-9.525,10.795) G9(-8.255,10.795) G10(-6.985,10.795) G11(-5.715,10.795) G12(-4.445,10.795) G13(-3.175,10.795) G14(-1.905,10.795) G15(-0.635,10.795) G16(0.635,10.795) G17(1.905,10.795) G18(3.175,10.795) G19(4.445,10.795) G20(5.715,10.795) G21(6.985,10.795) G22(8.255,10.795) G23(9.525,10.795) G24(10.795,10.795) G25(12.065,10.795) G26(13.335,10.795) G27(14.605,10.795) G28(15.875,10.795) G29(17.145,10.795) G30(18.415,10.795) H1(-18.415,9.525) H2(-17.145,9.525) H3(-15.875,9.525) H4(-14.605,9.525) H5(-13.335,9.525) H6(-12.065,9.525) H7(-10.795,9.525) H8(-9.525,9.525) H10(-6.985,9.525) H11(-5.715,9.525) H12(-4.445,9.525) H13(-3.175,9.525) H14(-1.905,9.525) H15(-0.635,9.525) H16(0.635,9.525) H17(1.905,9.525) H18(3.175,9.525) H19(4.445,9.525) H20(5.715,9.525) H21(6.985,9.525) H23(9.525,9.525) H24(10.795,9.525) H25(12.065,9.525) H26(13.335,9.525) H27(14.605,9.525) H28(15.875,9.525) H29(17.145,9.525) H30(18.415,9.525) J1(-18.415,8.255) J2(-17.145,8.255) J3(-15.875,8.255) J4(-14.605,8.255) J5(-13.335,8.255) J6(-12.065,8.255) J7(-10.795,8.255) J24(10.795,8.255) J25(12.065,8.255) J26(13.335,8.255) J27(14.605,8.255) J28(15.875,8.255) J29(17.145,8.255) J30(18.415,8.255) K1(-18.415,6.985) K2(-17.145,6.985) K3(-15.875,6.985) K4(-14.605,6.985) K5(-13.335,6.985) K6(-12.065,6.985) K7(-10.795,6.985) K8(-9.525,6.985) K23(9.525,6.985) K24(10.795,6.985) K25(12.065,6.985) K26(13.335,6.985) K27(14.605,6.985) K28(15.875,6.985) K29(17.145,6.985) K30(18.415,6.985) L1(-18.415,5.715) L2(-17.145,5.715) L3(-15.875,5.715) L4(-14.605,5.715) L5(-13.335,5.715) L6(-12.065,5.715) L7(-10.795,5.715) L8(-9.525,5.715) L23(9.525,5.715) L24(10.795,5.715) L25(12.065,5.715) L26(13.335,5.715) L27(14.605,5.715) L28(15.875,5.715) L29(17.145,5.715) L30(18.415,5.715) M1(-18.415,4.445) M2(-17.145,4.445) M3(-15.875,4.445) M4(-14.605,4.445) M5(-13.335,4.445) M6(-12.065,4.445) M7(-10.795,4.445) M8(-9.525,4.445) M12(-4.445,4.445) M13(-3.175,4.445) M14(-1.905,4.445) M15(-0.635,4.445) M16(0.635,4.445) M17(1.905,4.445) M18(3.175,4.445) M19(4.445,4.445) M23(9.525,4.445) M24(10.795,4.445) M25(12.065,4.445) M26(13.335,4.445) M27(14.605,4.445) M28(15.875,4.445) M29(17.145,4.445) M30(18.415,4.445) N1(-18.415,3.175) N2(-17.145,3.175) N3(-15.875,3.175) N4(-14.605,3.175) N5(-13.335,3.175) N6(-12.065,3.175) N7(-10.795,3.175) N8(-9.525,3.175) N12(-4.445,3.175) N13(-3.175,3.175) N14(-1.905,3.175) N15(-0.635,3.175) N16(0.635,3.175) N17(1.905,3.175) N18(3.175,3.175) N19(4.445,3.175) N23(9.525,3.175) N24(10.795,3.175) N25(12.065,3.175) N26(13.335,3.175) N27(14.605,3.175) N28(15.875,3.175) N29(17.145,3.175) N30(18.415,3.175) P1(-18.415,1.905) P2(-17.145,1.905) P3(-15.875,1.905) P4(-14.605,1.905) P5(-13.335,1.905) P6(-12.065,1.905) P7(-10.795,1.905) P8(-9.525,1.905) P12(-4.445,1.905) P13(-3.175,1.905) P14(-1.905,1.905) P15(-0.635,1.905) P16(0.635,1.905) P17(1.905,1.905) P18(3.175,1.905) P19(4.445,1.905) P23(9.525,1.905) P24(10.795,1.905) P25(12.065,1.905) P26(13.335,1.905) P27(14.605,1.905) P28(15.875,1.905) P29(17.145,1.905) P30(18.415,1.905) R1(-18.415,0.635) R2(-17.145,0.635) R3(-15.875,0.635) R4(-14.605,0.635) R5(-13.335,0.635) R6(-12.065,0.635) R7(-10.795,0.635) R8(-9.525,0.635) R12(-4.445,0.635) R13(-3.175,0.635) R14(-1.905,0.635) R15(-0.635,0.635) R16(0.635,0.635) R17(1.905,0.635) R18(3.175,0.635) R19(4.445,0.635) R23(9.525,0.635) R24(10.795,0.635) R25(12.065,0.635) R26(13.335,0.635) R27(14.605,0.635) R28(15.875,0.635) R29(17.145,0.635) R30(18.415,0.635) T1(-18.415,-0.635) T2(-17.145,-0.635) T3(-15.875,-0.635) T4(-14.605,-0.635) T5(-13.335,-0.635) T6(-12.065,-0.635) T7(-10.795,-0.635) T8(-9.525,-0.635) T12(-4.445,-0.635) T13(-3.175,-0.635) T14(-1.905,-0.635) T15(-0.635,-0.635) T16(0.635,-0.635) T17(1.905,-0.635) T18(3.175,-0.635) T19(4.445,-0.635) T23(9.525,-0.635) T24(10.795,-0.635) T25(12.065,-0.635) T26(13.335,-0.635) T27(14.605,-0.635) T28(15.875,-0.635) T29(17.145,-0.635) T30(18.415,-0.635) U1(-18.415,-1.905) U2(-17.145,-1.905) U3(-15.875,-1.905) U4(-14.605,-1.905) U5(-13.335,-1.905) U6(-12.065,-1.905) U7(-10.795,-1.905) U8(-9.525,-1.905) U12(-4.445,-1.905) U13(-3.175,-1.905) U14(-1.905,-1.905) U15(-0.635,-1.905) U16(0.635,-1.905) U17(1.905,-1.905) U18(3.175,-1.905) U19(4.445,-1.905) U23(9.525,-1.905) U24(10.795,-1.905) U25(12.065,-1.905) U26(13.335,-1.905) U27(14.605,-1.905) U28(15.875,-1.905) U29(17.145,-1.905) U30(18.415,-1.905) V1(-18.415,-3.175) V2(-17.145,-3.175) V3(-15.875,-3.175) V4(-14.605,-3.175) V5(-13.335,-3.175) V6(-12.065,-3.175) V7(-10.795,-3.175) V8(-9.525,-3.175) V12(-4.445,-3.175) V13(-3.175,-3.175) V14(-1.905,-3.175) V15(-0.635,-3.175) V16(0.635,-3.175) V17(1.905,-3.175) V18(3.175,-3.175) V19(4.445,-3.175) V23(9.525,-3.175) V24(10.795,-3.175) V25(12.065,-3.175) V26(13.335,-3.175) V27(14.605,-3.175) V28(15.875,-3.175) V29(17.145,-3.175) V30(18.415,-3.175) W1(-18.415,-4.445) W2(-17.145,-4.445) W3(-15.875,-4.445) W4(-14.605,-4.445) W5(-13.335,-4.445) W6(-12.065,-4.445) W7(-10.795,-4.445) W8(-9.525,-4.445) W12(-4.445,-4.445) W13(-3.175,-4.445) W14(-1.905,-4.445) W15(-0.635,-4.445) W16(0.635,-4.445) W17(1.905,-4.445) W18(3.175,-4.445) W19(4.445,-4.445) W23(9.525,-4.445) W24(10.795,-4.445) W25(12.065,-4.445) W26(13.335,-4.445) W27(14.605,-4.445) W28(15.875,-4.445) W29(17.145,-4.445) W30(18.415,-4.445) Y1(-18.415,-5.715) Y2(-17.145,-5.715) Y3(-15.875,-5.715) Y4(-14.605,-5.715) Y5(-13.335,-5.715) Y6(-12.065,-5.715) Y7(-10.795,-5.715) Y8(-9.525,-5.715) Y23(9.525,-5.715) Y24(10.795,-5.715) Y25(12.065,-5.715) Y26(13.335,-5.715) Y27(14.605,-5.715) Y28(15.875,-5.715) Y29(17.145,-5.715) Y30(18.415,-5.715)
Top Overlay:
  lines w0.127: -20.32,18.415 -20.32,20.32 -18.415,20.32 ; -20,-20 20,-20 20,20 -20,20 -20,-20
Top Paste:
  drawing of 760 lines, arcs and shapes, not listed
Top Solder:
  drawing of 760 lines, arcs and shapes, not listed

## SOT864-1 [mm]
pads (25):
  rect 0.6x1.35 smd: 1(-3.675,-2.925) 12(3.675,-2.925) 13(3.675,2.925) 24(-3.675,2.925)
  rect 0.4x1.35 smd: 2(-2.925,-2.925) 3(-2.275,-2.925) 4(-1.625,-2.925) 5(-0.975,-2.925) 6(-0.325,-2.925) 7(0.325,-2.925) 8(0.975,-2.925) 9(1.625,-2.925) 10(2.275,-2.925) 11(2.925,-2.925) 14(2.925,2.925) 15(2.275,2.925) 16(1.625,2.925) 17(0.975,2.925) 18(0.325,2.925) 19(-0.325,2.925) 20(-0.975,2.925) 21(-1.625,2.925) 22(-2.275,2.925) 23(-2.925,2.925)
  rect 4.4x3.3 smd: CP(0,0)
Top Overlay:
  circle w0: c-4.45,-4.21 r0.4
  lines w0.127: -3.9,-2.2 -3.9,2.2 ; 3.9,-2.2 3.9,2.2
Top Paste:
  rectangle: -1.3,0.325 -0.325,1.3
  rectangle: 0.325,0.325 1.3,1.3
  rectangle: -1.3,-1.3 -0.325,-0.325
  rectangle: 0.325,-1.3 1.3,-0.325
Mechanical 16:
  rectangle: -0.45,2.2 -0.2,3.2
  rectangle: -1.1,2.2 -0.85,3.2
  rectangle: -1.75,2.2 -1.5,3.2
  rectangle: -2.4,2.2 -2.15,3.2
  rectangle: -3.05,2.2 -2.8,3.2
  rectangle: -3.7,2.2 -3.45,3.2
  rectangle: 0.2,2.2 0.45,3.2
  rectangle: 0.85,2.2 1.1,3.2
  rectangle: 1.5,2.2 1.75,3.2
  rectangle: 2.15,2.2 2.4,3.2
  rectangle: 2.8,2.2 3.05,3.2
  rectangle: 3.45,2.2 3.7,3.2
  rectangle: -0.45,-3.2 -0.2,-2.2
  rectangle: -1.1,-3.2 -0.85,-2.2
  rectangle: -1.75,-3.2 -1.5,-2.2
  rectangle: -2.4,-3.2 -2.15,-2.2
  rectangle: -3.05,-3.2 -2.8,-2.2
  rectangle: -3.7,-3.2 -3.45,-2.2
  rectangle: 0.2,-3.2 0.45,-2.2
  rectangle: 0.85,-3.2 1.1,-2.2
  rectangle: 1.5,-3.2 1.75,-2.2
  rectangle: 2.15,-3.2 2.4,-2.2
  rectangle: 2.8,-3.2 3.05,-2.2
  rectangle: 3.45,-3.2 3.7,-2.2
  lines w0.127: -3.9,-2.2 3.9,-2.2 ; -3.9,2.2 3.9,2.2

## SOT865-1 [mm]
pads (33):
  rect 1.1x0.28 smd: 1(-3.45,2.275) 2(-3.45,1.625) 3(-3.45,0.975) 4(-3.45,0.325) 5(-3.45,-0.325) 6(-3.45,-0.975) 7(-3.45,-1.625) 8(-3.45,-2.275) 17(3.45,-2.275) 18(3.45,-1.625) 19(3.45,-0.975) 20(3.45,-0.325) 21(3.45,0.325) 22(3.45,0.975) 23(3.45,1.625) 24(3.45,2.275)
  rect 0.28x1.1 smd: 9(-2.275,-3.45) 10(-1.625,-3.45) 11(-0.975,-3.45) 12(-0.325,-3.45) 13(0.325,-3.45) 14(0.975,-3.45) 15(1.625,-3.45) 16(2.275,-3.45) 25(2.275,3.45) 26(1.625,3.45) 27(0.975,3.45) 28(0.325,3.45) 29(-0.325,3.45) 30(-0.975,3.45) 31(-1.625,3.45) 32(-2.275,3.45)
  rect 4.5x4.5 smd: 33(0,0)
Top Overlay:
  circle w0: c-3.12,3 r0.224
  lines w0.127: -3.625,-2.675 -3.625,-3.625 -2.675,-3.625 ; -3.625,2.675 -3.625,3.625 -2.675,3.625 ; 2.675,-3.625 3.625,-3.625 3.625,-2.675 ; 2.675,3.625 3.625,3.625 3.625,2.675
Top Paste:
  rectangle: -0.35,-0.35 0.35,0.35
  rectangle: 0.65,-0.35 1.35,0.35
  rectangle: -1.35,-0.35 -0.65,0.35
  rectangle: -1.35,0.65 -0.65,1.35
  rectangle: -0.35,0.65 0.35,1.35
  rectangle: 0.65,0.65 1.35,1.35
  rectangle: -1.35,-1.35 -0.65,-0.65
  rectangle: -0.35,-1.35 0.35,-0.65
  rectangle: 0.65,-1.35 1.35,-0.65
Mechanical 16:
  lines w0.127: -4.1,-2.55 -4.1,2.55 -3.625,2.55 -3.625,3.625 -2.55,3.625 -2.55,4.1 2.55,4.1 2.55,3.625 3.625,3.625 3.625,2.55 4.1,2.55 4.1,-2.55 3.625,-2.55 3.625,-3.625 2.55,-3.625 2.55,-4.1 -2.55,-4.1 -2.55,-3.625 -3.625,-3.625 -3.625,-2.55 -4.1,-2.55
  text "SOT865-1" at -0.75,-2 h0.17

## SOT865-2 [mm]
pads (33):
  rect 1.1x0.28 smd: 1(-3.45,2.275) 2(-3.45,1.625) 3(-3.45,0.975) 4(-3.45,0.325) 5(-3.45,-0.325) 6(-3.45,-0.975) 7(-3.45,-1.625) 8(-3.45,-2.275) 17(3.45,-2.275) 18(3.45,-1.625) 19(3.45,-0.975) 20(3.45,-0.325) 21(3.45,0.325) 22(3.45,0.975) 23(3.45,1.625) 24(3.45,2.275)
  rect 0.28x1.1 smd: 9(-2.275,-3.45) 10(-1.625,-3.45) 11(-0.975,-3.45) 12(-0.325,-3.45) 13(0.325,-3.45) 14(0.975,-3.45) 15(1.625,-3.45) 16(2.275,-3.45) 25(2.275,3.45) 26(1.625,3.45) 27(0.975,3.45) 28(0.325,3.45) 29(-0.325,3.45) 30(-0.975,3.45) 31(-1.625,3.45) 32(-2.275,3.45)
  rect 4.7x4.7 smd: 33(0,0)
Top Overlay:
  circle w0: c-3.12,3 r0.224
  lines w0.127: -3.625,-2.675 -3.625,-3.1 -3.1,-3.625 -2.675,-3.625 ; -3.625,2.675 -3.625,3.1 -3.1,3.625 -2.675,3.625 ; 2.675,-3.625 3.1,-3.625 3.625,-3.1 3.625,-2.675 ; 2.675,3.625 3.1,3.625 3.625,3.1 3.625,2.675
Top Paste:
  rectangle: -0.35,-0.35 0.35,0.35
  rectangle: 0.65,-0.35 1.35,0.35
  rectangle: -1.35,-0.35 -0.65,0.35
  rectangle: -1.35,0.65 -0.65,1.35
  rectangle: -0.35,0.65 0.35,1.35
  rectangle: 0.65,0.65 1.35,1.35
  rectangle: -1.35,-1.35 -0.65,-0.65
  rectangle: -0.35,-1.35 0.35,-0.65
  rectangle: 0.65,-1.35 1.35,-0.65
Mechanical 16:
  lines w0.127: -4.1,-2.55 -4.1,2.55 -3.625,2.55 -3.625,3.1 -3.1,3.625 -2.55,3.625 -2.55,4.1 2.55,4.1 2.55,3.625 3.1,3.625 3.625,3.1 3.625,2.55 4.1,2.55 4.1,-2.55 3.625,-2.55 3.625,-3.1 3.1,-3.625 2.55,-3.625 2.55,-4.1 -2.55,-4.1 -2.55,-3.625 -3.1,-3.625 -3.625,-3.1 -3.625,-2.55 -4.1,-2.55
  text "SOT865-2" at -0.75,-2 h0.17

## SOT865-3 [mm]
pads (33):
  rect 1.1x0.28 smd: 1(-3.45,2.275) 2(-3.45,1.625) 3(-3.45,0.975) 4(-3.45,0.325) 5(-3.45,-0.325) 6(-3.45,-0.975) 7(-3.45,-1.625) 8(-3.45,-2.275) 17(3.45,-2.275) 18(3.45,-1.625) 19(3.45,-0.975) 20(3.45,-0.325) 21(3.45,0.325) 22(3.45,0.975) 23(3.45,1.625) 24(3.45,2.275)
  rect 0.28x1.1 smd: 9(-2.275,-3.45) 10(-1.625,-3.45) 11(-0.975,-3.45) 12(-0.325,-3.45) 13(0.325,-3.45) 14(0.975,-3.45) 15(1.625,-3.45) 16(2.275,-3.45) 25(2.275,3.45) 26(1.625,3.45) 27(0.975,3.45) 28(0.325,3.45) 29(-0.325,3.45) 30(-0.975,3.45) 31(-1.625,3.45) 32(-2.275,3.45)
  rect 4.7x4.7 smd: 33(0,0)
Top Overlay:
  circle w0: c-3.12,3 r0.224
  lines w0.127: -3.625,-2.675 -3.625,-3.625 -2.675,-3.625 ; -3.625,2.675 -3.625,3.625 -2.675,3.625 ; 2.675,-3.625 3.625,-3.625 3.625,-2.675 ; 2.675,3.625 3.625,3.625 3.625,2.675
Top Paste:
  rectangle: -0.35,-0.35 0.35,0.35
  rectangle: 0.65,-0.35 1.35,0.35
  rectangle: -1.35,-0.35 -0.65,0.35
  rectangle: -1.35,0.65 -0.65,1.35
  rectangle: -0.35,0.65 0.35,1.35
  rectangle: 0.65,0.65 1.35,1.35
  rectangle: -1.35,-1.35 -0.65,-0.65
  rectangle: -0.35,-1.35 0.35,-0.65
  rectangle: 0.65,-1.35 1.35,-0.65
Mechanical 16:
  lines w0.127: -4.1,-2.55 -4.1,2.55 -3.625,2.55 -3.625,3.625 -2.55,3.625 -2.55,4.1 2.55,4.1 2.55,3.625 3.625,3.625 3.625,2.55 4.1,2.55 4.1,-2.55 3.625,-2.55 3.625,-3.625 2.55,-3.625 2.55,-4.1 -2.55,-4.1 -2.55,-3.625 -3.625,-3.625 -3.625,-2.55 -4.1,-2.55
  text "SOT865-3" at -0.75,-2.125 h0.17

## SOT873-1 [mm]
pads (8):
  rect 0.4x0.83 smd: 1(-0.975,-1.535) 2(-0.325,-1.535) 3(0.325,-1.535) 4(0.975,-1.535)
  rect 0.4x0.75 smd: 5(0.975,1.575) 6(0.325,1.575) 7(-0.325,1.575) 8(-0.975,1.575)
Top Layer:
  region: 0,0 0.254,0 0.254,0.254 0,0.254
Top Paste:
  rectangle: -0.475,-1.95 -0.175,-1.12
  rectangle: 0.175,-1.95 0.475,-1.12
  rectangle: 0.825,-1.95 1.125,-1.12
  rectangle: -1.125,-1.95 -0.825,-1.12
  rectangle: -1.125,1.2 -0.825,1.95
  rectangle: -0.475,1.2 -0.175,1.95
  rectangle: 0.175,1.2 0.475,1.95
  rectangle: 0.825,1.2 1.125,1.95
  rectangle: -0.944,0.39 -0.309,0.9
  rectangle: -0.944,-0.47 -0.309,0.04
  rectangle: 0.309,0.39 0.944,0.9
  rectangle: 0.309,-0.47 0.944,0.04
Top Solder:
  rectangle: -0.575,-2 -0.075,-1.07
  rectangle: 0.075,-2 0.575,-1.07
  rectangle: 0.725,-2 1.225,-1.07
  rectangle: -1.225,-2 -0.725,-1.07
  region: 0,0 0.254,0 0.254,0.254 0,0.254
Mechanical 16:
  rectangle: -1.65,-1.65 0,0
  lines w0.127: -1.65,-1.65 1.65,-1.65 1.65,1.65 -1.65,1.65 -1.65,-1.65

## SOT883(B) [mm]
pads (3):
  rrect25% 0.4x0.25 smd: 1(-0.35,0.225) 2(-0.35,-0.225)
  rrect25% 0.4x0.7 smd: 3(0.35,0)
Top Paste:
  rectangle: 0.2,-0.3 0.5,0.3
  region: 0,0 0.254,0 0.254,0.254 0,0.254
  region: 0,0 0.254,0 0.254,0.254 0,0.254
Top Solder:
  rectangle: 0.1,-0.4 0.6,0.4
  rectangle: -0.6,0.05 -0.1,0.4
  rectangle: -0.6,-0.4 -0.1,-0.05
Mechanical 16:
  lines w0.127: -0.5,-0.3 0.5,-0.3 0.5,0.3 -0.5,0.3 -0.5,-0.3
  text "SOT883(B)" at -0.75,-0.75 h0.17

## SOT886 [mm]
pads (6):
  rect 0.27x0.325 smd: 1(-0.5,-0.338) 2(0,-0.338) 3(0.5,-0.338) 4(0.5,0.338) 5(0,0.338) 6(-0.5,0.338)
Top Overlay:
  circle w0: c-0.5,-0.8 r0.19
Mechanical 16:
  rectangle: -0.7,-0.5 0,0
  lines w0.127: -0.75,-0.5 0.75,-0.5 0.75,0.5 -0.75,0.5 -0.75,-0.5

## SOT891 [mm]
pads (6):
  rect 0.15x0.5 smd: 1(-0.35,-0.35) 2(0,-0.35) 3(0.35,-0.35) 4(0.35,0.35) 5(0,0.35) 6(-0.35,0.35)
Top Overlay:
  circle w0: c-0.8,-0.6 r0.19
Mechanical 16:
  rectangle: -0.5,-0.5 0,0
  lines w0.127: -0.5,-0.5 0.5,-0.5 0.5,0.5 -0.5,0.5 -0.5,-0.5
  text "SOT891" at -0.5,0.75 h0.17

## SOT902-1/2/3 [mm]
pads (8):
  rect 0.4x0.32 smd: 1(0.6,-0.55)
  rect 0.4x0.22 smd: 2(0.6,0) 3(0.6,0.5) 5(-0.6,0.5) 6(-0.6,0) 7(-0.6,-0.5)
  rect 0.22x0.4 smd: 4(0,0.6) 8(0,-0.6)
Top Layer keep-out:
  rectangle: -0.25,-0.25 0.25,0.25
Top Overlay:
  circle w0: c1.2,-0.5 r0.2
Top Paste:
  rectangle: 0.375,-0.635 0.825,-0.365
  rectangle: 0.375,-0.135 0.825,0.135
  rectangle: -0.825,0.365 -0.375,0.635
  rectangle: 0.375,0.365 0.825,0.635
  rectangle: -0.825,-0.135 -0.375,0.135
  rectangle: -0.825,-0.635 -0.375,-0.365
  region: -0.135,0.825 -0.135,0.375 0.135,0.375 0.135,0.825
  region: -0.135,-0.375 -0.135,-0.825 0.135,-0.825 0.135,-0.375
Mechanical 16:
  lines w0.1: -0.8,-0.8 0.8,-0.8 0.8,0.8 -0.8,0.8 -0.8,-0.8
  text "SOT902-1/2/3" at -0.5,-1.25 h0.17